# Altium footprint library Rez-Axial Pot.PcbLib: 108 footprints (part 5 of 7)
Each footprint in its own frame and in the unit in brackets; x right, y up, seen from the top. Pads: shape width x height; smd on the part's side, far side on the other; paste and mask are expansions set on the pad; w line width, h text height; cw(c..) or ccw(c..) is an arc to the next point about the centre after c.
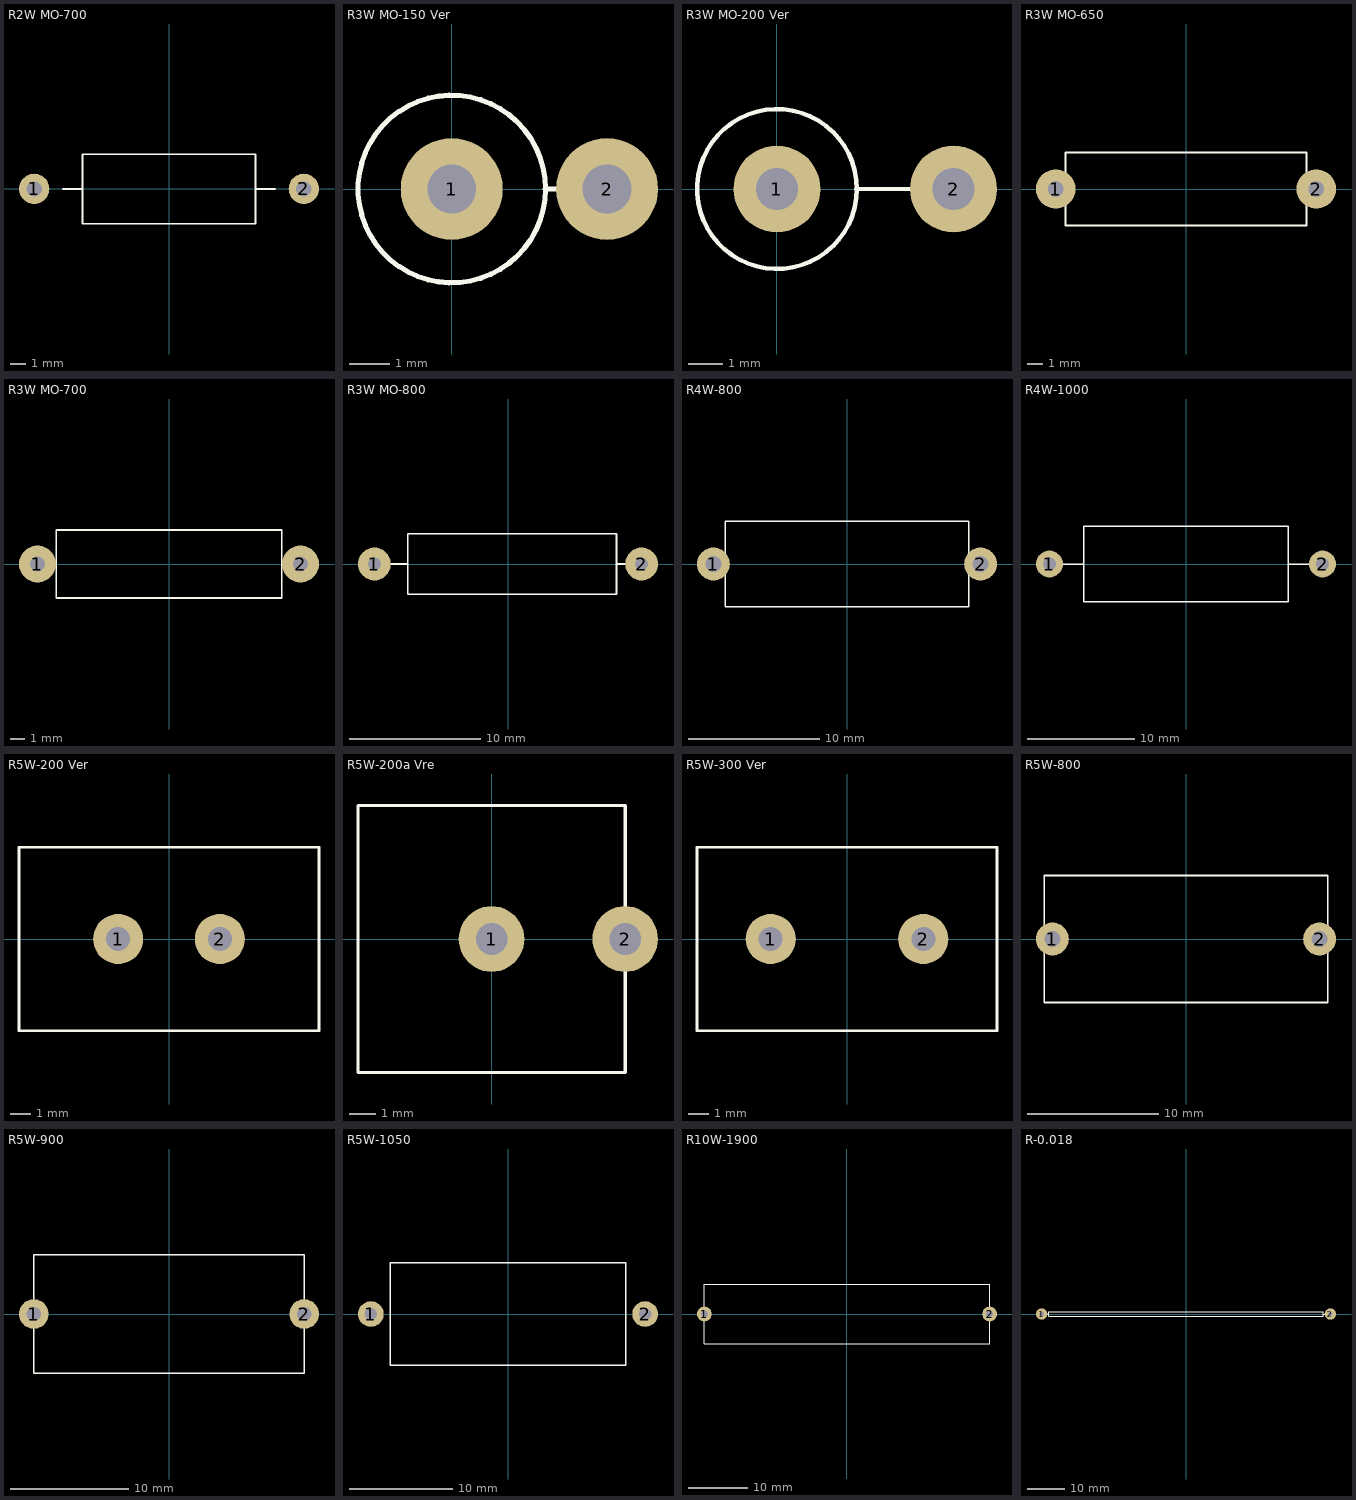
[diagram p4: the footprints below, top view; thin cyan lines are the x and y axes]

## R2W MO-700 [mm]
pads (2):
  round 2 hole 1: 1(-8.89,0) 2(8.89,0)
TopOverlay:
  lines w0.127: -6.985,0 -5.715,0 ; 5.715,0 6.985,0 ; -5.715,-2.3 5.715,-2.3 5.715,2.286 -5.715,2.286 -5.715,-2.3
3D body: height 4.6, standoff -2.54, extent -9.19,-2.3 9.19,2.3

## R3W MO-150 Ver [mm]
pads (2):
  round 2.5 hole 1.2: 1(0,0) 2(3.81,0)
TopOverlay:
  circle w0.127: c0,0 r2.3
  lines w0.127: 2.286,0 3.175,0
3D body: height 18.31, standoff -2.03, extent -2.302,-2.302 4.21,2.302

## R3W MO-200 Ver [mm]
pads (2):
  round 2.5 hole 1.2: 1(0,0) 2(5.08,0)
TopOverlay:
  circle w0.127: c0,0 r2.3
  lines w0.127: 2.286,0 4.445,0
3D body: height 18.95, standoff -2.03, extent -2.302,-2.302 5.48,2.302

## R3W MO-650 [mm]
pads (2):
  round 2.5 hole 1: 1(-8.255,0) 2(8.255,0)
TopOverlay:
  lines w0.127: -8.255,0 -7.62,0 ; 7.62,0 8.255,0 ; -7.62,-2.302 7.62,-2.302 7.62,2.302 -7.62,2.302 -7.62,-2.302
3D body: height 4.6, standoff -2.54, extent -8.605,-2.302 8.605,2.302

## R3W MO-700 [mm]
pads (2):
  round 2.5 hole 1: 1(-8.89,0) 2(8.89,0)
TopOverlay:
  lines w0.127: -8.89,0 -7.62,0 ; 7.62,0 8.89,0 ; -7.62,-2.302 7.62,-2.302 7.62,2.302 -7.62,2.302 -7.62,-2.302
3D body: height 4.6, standoff -2.54, extent -9.24,-2.302 9.24,2.302

## R3W MO-800 [mm]
pads (2):
  round 2.5 hole 1: 1(-10.16,0) 2(10.16,0)
TopOverlay:
  lines w0.127: -10.16,0 -7.62,0 ; 8.255,0 10.16,0 ; -7.62,-2.302 8.255,-2.302 8.255,2.302 -7.62,2.302 -7.62,-2.302
3D body: height 4.6, standoff -2.54, extent -10.51,-2.302 10.51,2.302

## R4W-800 [mm]
pads (2):
  round 2.5 hole 1.2: 1(-10.16,0) 2(10.16,0)
TopOverlay:
  lines w0.127: -9.5,0 -9.25,0 ; 9.25,0 9.5,0 ; -9.25,-3.25 -9.25,3.25 9.25,3.25 9.25,-3.25 -9.25,-3.25
3D body: height 6.5, standoff -2.5, extent -10.56,-3.25 10.56,3.25

## R4W-1000 [mm]
pads (2):
  round 2.5 hole 1.2: 1(-12.7,0) 2(12.7,0)
TopOverlay:
  lines w0.127: -12.7,0 -9.525,0 ; 9.525,0 12.7,0 ; -9.525,-3.5 -9.525,3.5 9.525,3.5 9.525,-3.5 -9.525,-3.5
3D body: height 1.51, standoff -8.94, extent -12.7,-3.5 13.58,3.5

## R5W-200 Ver [mm]
pads (2):
  round 2.5 hole 1.2: 1(-2.54,0) 2(2.54,0)
TopOverlay:
  lines w0.127: -7.493,-4.572 -7.493,4.572 7.493,4.572 7.493,-4.572 -7.493,-4.572

## R5W-200a Vre [mm]
pads (2):
  round 2.5 hole 1.2: 1(0,0) 2(5.08,0)
TopOverlay:
  lines w0.127: -5.08,-5.08 -5.08,5.08 5.08,5.08 5.08,-5.08 -5.08,-5.08
3D body: height 23.05, standoff -2.4, extent -5.01,-5 5.53,5

## R5W-300 Ver [mm]
pads (2):
  round 2.5 hole 1.2: 1(-3.81,0) 2(3.81,0)
TopOverlay:
  lines w0.127: -7.493,-4.572 7.493,-4.572 7.493,4.572 -7.493,4.572 -7.493,-4.572

## R5W-800 [mm]
pads (2):
  round 2.5 hole 1.2: 1(-10.16,0) 2(10.16,0)
TopOverlay:
  lines w0.127: -10.795,-4.826 -10.795,4.826 10.795,4.826 10.795,-4.826 -10.795,-4.826
3D body: height 7.1, standoff -2.4, extent -10.76,-4.8 10.76,4.8

## R5W-900 [mm]
pads (2):
  round 2.5 hole 1.2: 1(-11.43,0) 2(11.43,0)
TopOverlay:
  lines w0.127: -11.43,-5 -11.43,5 11.43,5 11.43,-5 -11.43,-5
3D body: height 10.01, standoff -2.62, extent -11.88,-5 11.88,5

## R5W-1050 [mm]
pads (2):
  round 2.5 hole 1.2: 1(-13.335,0) 2(13.335,0)
TopOverlay:
  lines w0.127: -11.43,-5 11.43,-5 11.43,5 -11.43,5 -11.43,-5
3D body: height 10.01, standoff -2.62, extent -13.785,-5 13.785,5

## R10W-1900 [mm]
pads (2):
  round 2.5 hole 1.2: 1(-24.13,0) 2(24.13,0)
TopOverlay:
  lines w0.127: -24.13,-5 24.13,-5 24.13,5 -24.13,5 -24.13,-5
3D body: height 10.01, standoff -2.62, extent -24.59,-5 24.59,5

## R-0.018 [mm]
pads (2):
  round 3 hole 1.2: 1(-38.1,0) 2(38.1,0)
TopOverlay:
  lines w0.127: -38.1,0 -36.195,0 ; 36.195,0 38.1,0 ; -36.195,-0.635 -36.195,0.635 36.195,0.635 36.195,-0.635 -36.195,-0.635
3D body: height 2.5, standoff -2.5, extent -38.6,-0.5 38.6,0.5